# Altium footprint library IoWLabs.PcbLib: 55 footprints (part 4 of 4)
Each footprint in its own frame and in the unit in brackets; x right, y up, seen from the top. Pads: shape width x height; smd on the part's side, far side on the other; paste and mask are expansions set on the pad; w line width, h text height; cw(c..) or ccw(c..) is an arc to the next point about the centre after c.
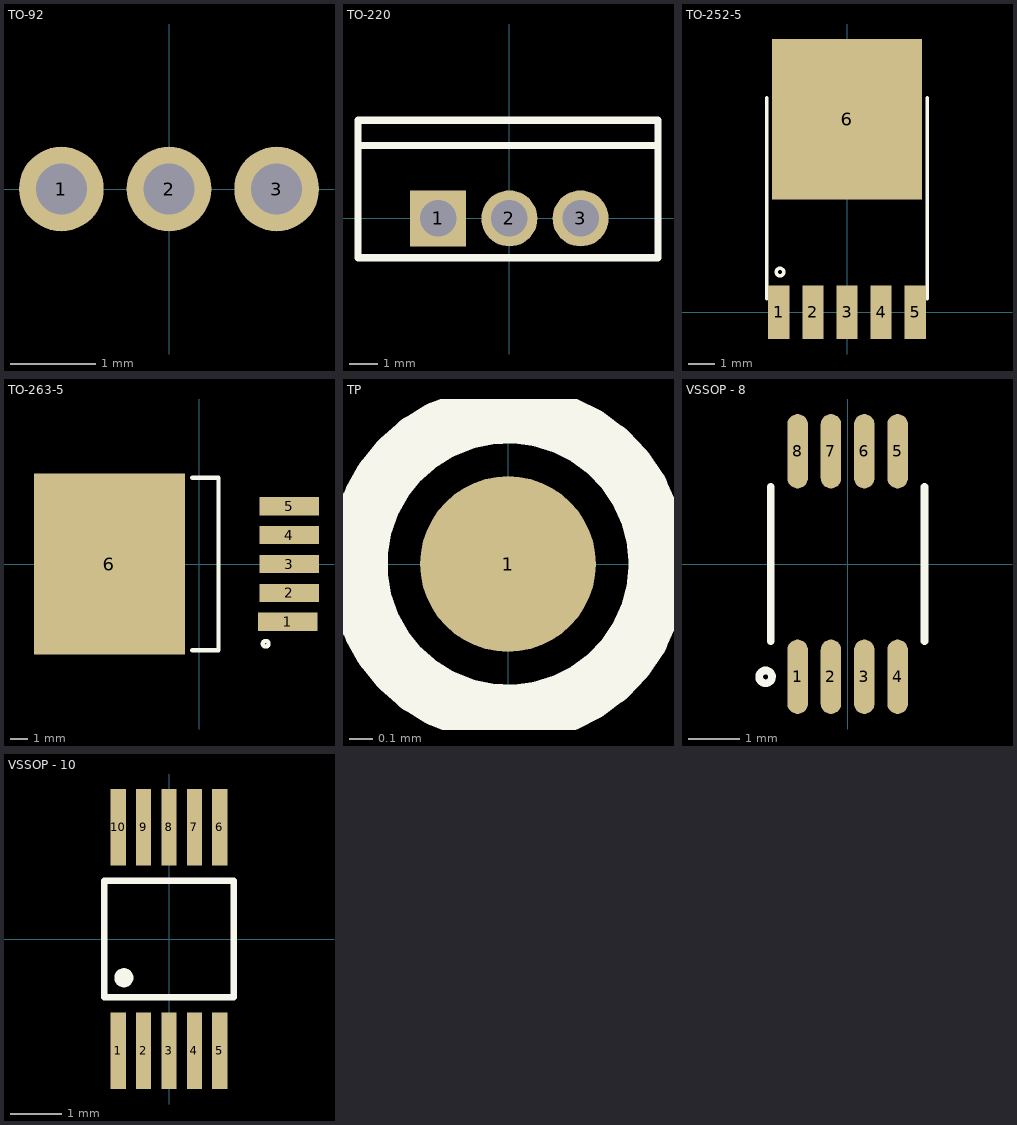
[diagram p3: the footprints below, top view; thin cyan lines are the x and y axes]

## TO-92 [mm]
pads (3):
  round 1 hole 0.6: 1(-1.27,0) 2(0,0) 3(1.27,0)
3D body "TO-92_Type.STEP": height 7, standoff -12, extent -2.339,-1 2.3,2.2

## TO-220 [mm] "Generic TO-220"
pads (3):
  rect 2x2 hole 1.3: 1(-2.54,0)
  round 2 hole 1.3: 2(0,0) 3(2.54,0)
Top Overlay:
  lines w0.254: -5.4,2.6 5.3,2.6 ; -5.4,-1.4 -5.4,3.5 5.3,3.5 5.3,-1.4 -5.4,-1.4
3D body "TO220.STEP": height 22.86, standoff -8.38, extent -5.335,-1.43 5.335,3.5

## TO-252-5 [mm]
pads (6):
  rect 0.8x2 smd: 1(-2.54,0) 2(-1.27,0) 3(0,0) 4(1.27,0) 5(2.54,0)
  rect 5.6x6 smd: 6(0,7.2)
Top Overlay:
  circle w0.127: c-2.5,1.5 r0.141
  lines w0.127: -3,0.5 -3,8 ; 3,0.5 3,8
3D body "TO-252-5.stp": height 2.29, standoff -0.01, extent -3.27,-0.12 3.27,9.549

## TO-263-5 [mm]
pads (6):
  rect 3.5x1.069 smd: 1(5.2,-3.404) 2(5.3,-1.702) 3(5.3,0) 4(5.3,1.702) 5(5.3,3.404)
  rect 8.89x10.66 smd: 6(-5.3,0)
Top Overlay:
  circle w0.254: c3.907,-4.699 r0.165
  lines w0.254: -0.411,-5.08 1.126,-5.08 1.126,5.08 -0.411,5.08
Mechanical 1:
3D body "TS5B.STEP": height 4.58, standoff 0, extent -8.55,-5.1 5.8,5.08

## TP [mil]
pads (1):
  round 30 smd: 1(0,0)
Top Overlay:
  circle w10: c0,0 r25.59

## VSSOP - 8 [mm]
pads (8):
  oval 0.4x1.45 smd: 1(-0.975,-2.2) 2(-0.325,-2.2) 3(0.325,-2.2) 4(0.975,-2.2) 5(0.975,2.2) 6(0.325,2.2) 7(-0.325,2.2) 8(-0.975,2.2)
Top Overlay:
  lines w0.15: -1.601,-2.075 ccw(c-1.6,-2.2) -1.599,-2.075 ; -1.5,-1.5 -1.5,1.5 ; 1.5,-1.5 1.5,1.5
3D body "DGK0008A.stp": height 1.1, standoff 0, extent -1.499,-2.451 1.498,2.451

## VSSOP - 10 [mm] "DGSM-10"
pads (10):
  rect 0.3x1.5 smd: 1(-1,-2.2) 2(-0.5,-2.2) 3(0,-2.2) 4(0.5,-2.2) 5(1,-2.2) 6(1,2.2) 7(0.5,2.2) 8(0,2.2) 9(-0.5,2.2) 10(-1,2.2)
Top Overlay:
  circle w0.254: c-0.889,-0.762 r0.06
  lines w0.127: -1.27,-1.143 1.27,-1.143 1.27,1.143 -1.27,1.143 -1.27,-1.143
3D body "MSOP10-3-0.5mm.STEP": height 1.1, standoff 0, extent -1.5,-2.45 1.5,2.45